# Altium footprint library Mylib.PcbLib: 320 footprints (part 9 of 20)
Each footprint in its own frame and in the unit in brackets; x right, y up, seen from the top. Pads: shape width x height; smd on the part's side, far side on the other; paste and mask are expansions set on the pad; w line width, h text height; cw(c..) or ccw(c..) is an arc to the next point about the centre after c.
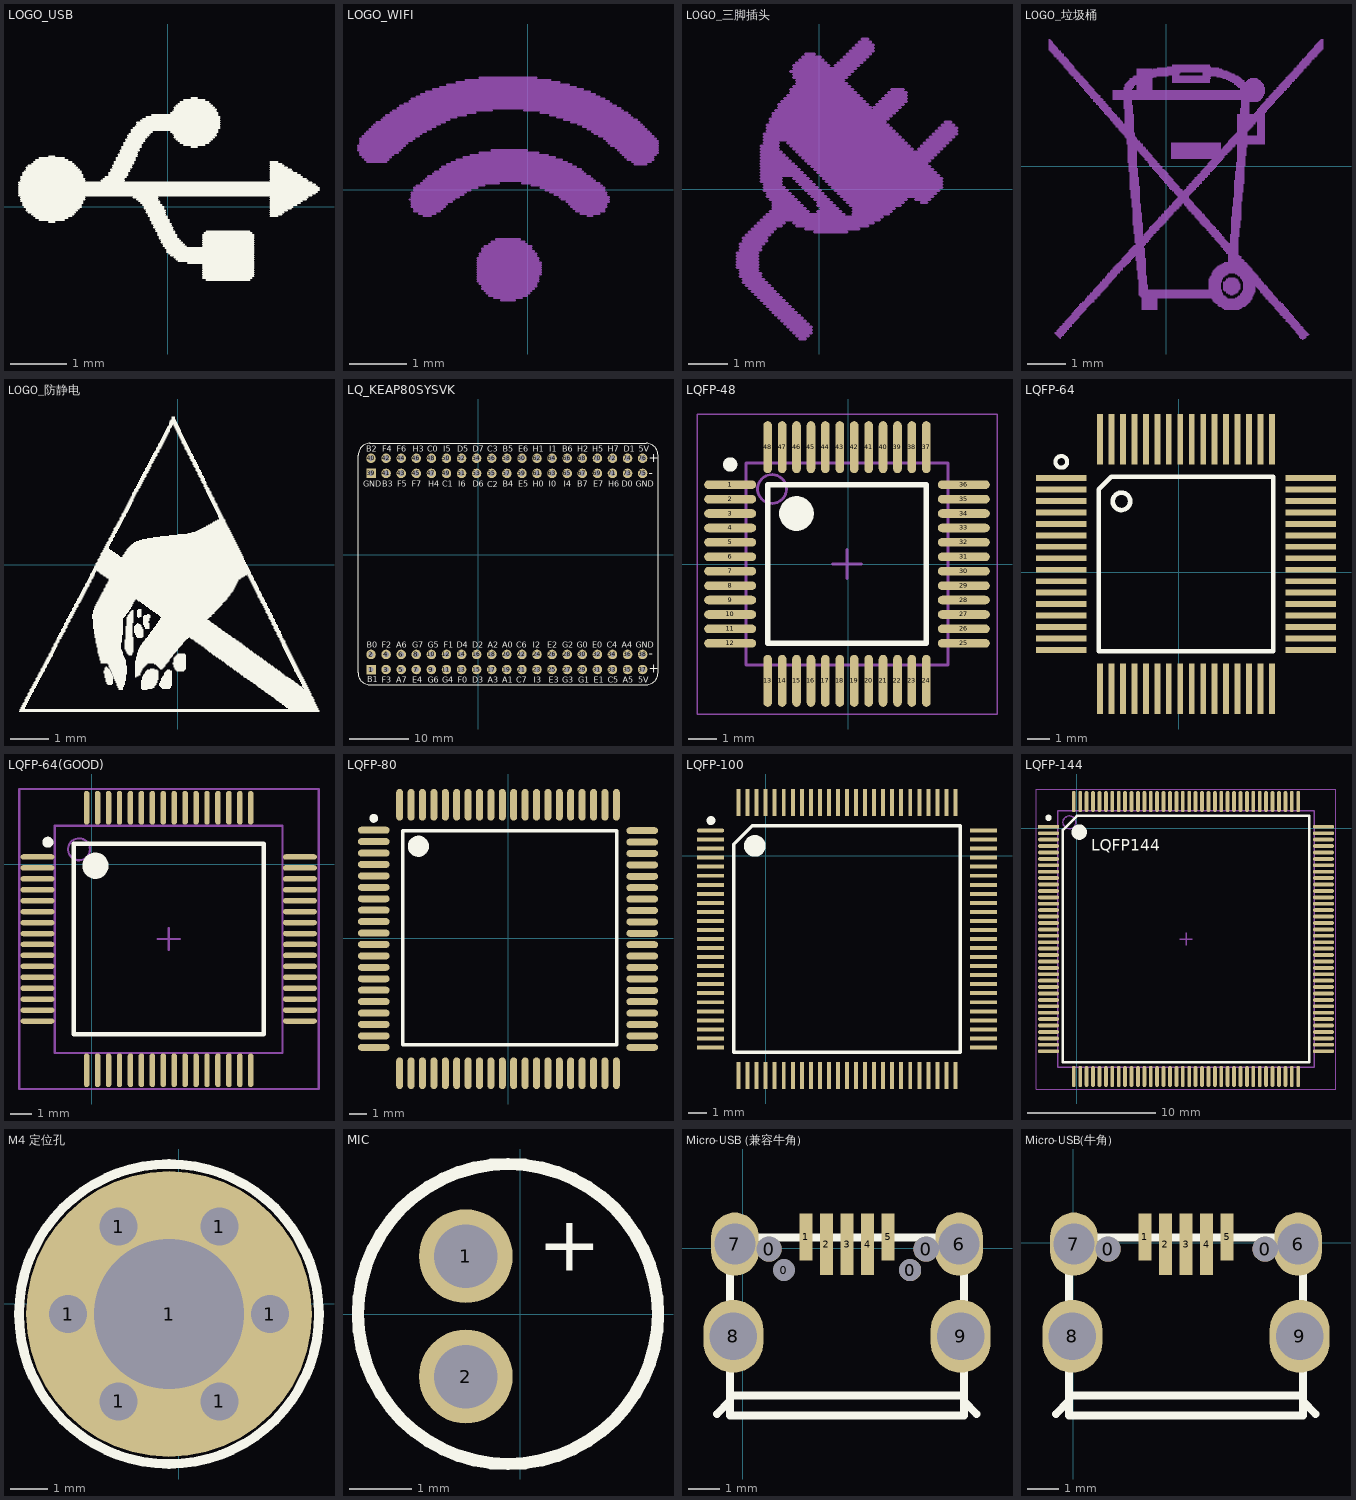
[diagram p8: the footprints below, top view; thin cyan lines are the x and y axes]

## LOGO_USB [mm]
Top Overlay:
  drawing of 166 lines, arcs and shapes, not listed

## LOGO_WIFI [mm]
Top Solder:
  lines w0.041: -2.946,0.686 -2.215,0.686 ; -2.946,0.726 -2.174,0.726 ; -2.946,0.767 -2.134,0.767 ; -2.906,0.605 -2.337,0.605 ; -2.906,0.645 -2.256,0.645 ; -2.906,0.808 -2.093,0.808 ; -2.906,0.848 -2.012,0.848 ; -2.906,0.889 -1.971,0.889 ; -2.865,0.564 -2.377,0.564 ; -2.865,0.93 -1.89,0.93 ; -2.824,0.523 -2.418,0.523 ; -2.824,0.97 -1.849,0.97 ; -2.784,0.483 -2.459,0.483 ; -2.784,1.011 -1.768,1.011 ; -2.743,1.052 -1.687,1.052 ; -2.703,1.092 -1.605,1.092 ; -2.662,1.133 -1.524,1.133 ; -2.621,1.173 -1.443,1.173 ; -2.54,1.214 -1.361,1.214 ; -2.499,1.255 -1.24,1.255 ; -2.459,1.295 -1.077,1.295 ; -2.377,1.336 -0.914,1.336 ; -2.337,1.377 -0.63,1.377 ; -2.256,1.417 1.605,1.417 ; -2.215,1.458 1.524,1.458 ; -2.134,1.499 1.443,1.499 ; -2.052,-0.168 -1.28,-0.168 ; -2.052,1.539 1.402,1.539 ; -2.012,-0.29 -1.443,-0.29 ; -2.012,-0.249 -1.402,-0.249 ; -2.012,-0.208 -1.321,-0.208 ; -2.012,-0.127 -1.199,-0.127 ; -2.012,-0.086 -1.118,-0.086 ; -2.012,-0.046 -1.077,-0.046 ; -2.012,1.58 1.321,1.58 ; -1.971,-0.371 -1.524,-0.371 ; -1.971,-0.33 -1.483,-0.33 ; -1.971,-0.005 -0.996,-0.005 ; -1.971,0.036 -0.874,0.036 ; -1.93,0.076 -0.752,0.076 ; -1.93,1.621 1.24,1.621 ; -1.89,-0.411 -1.605,-0.411 ; -1.849,0.117 -0.508,0.117 ; -1.849,1.661 1.158,1.661 ; -1.808,-0.452 -1.687,-0.452 ; -1.808,0.157 1.158,0.157 ; -1.768,0.198 1.118,0.198 ; -1.768,1.702 1.077,1.702 ; -1.727,0.239 1.077,0.239 ; -1.646,0.279 0.996,0.279 ; -1.646,1.742 0.955,1.742 ; -1.605,0.32 0.955,0.32 ; -1.524,0.361 0.914,0.361 ; -1.524,1.783 0.833,1.783 ; -1.483,0.401 0.833,0.401 ; -1.402,0.442 0.752,0.442 ; -1.402,1.824 0.711,1.824 ; -1.321,0.483 0.671,0.483 ; -1.24,0.523 0.589,0.523 ; -1.24,1.864 0.549,1.864 ; -1.118,0.564 0.467,0.564 ; -1.077,1.905 0.386,1.905 ; -0.996,0.605 0.345,0.605 ; -0.874,-1.59 0.183,-1.59 ; -0.874,-1.549 0.183,-1.549 ; -0.874,-1.509 0.183,-1.509 ; -0.874,-1.468 0.224,-1.468 ; -0.874,-1.427 0.224,-1.427 ; -0.874,-1.387 0.224,-1.387 ; -0.874,-1.346 0.224,-1.346 ; -0.874,-1.306 0.224,-1.306 ; -0.874,-1.265 0.224,-1.265 ; -0.874,-1.224 0.183,-1.224 ; -0.874,-1.184 0.183,-1.184 ; -0.833,-1.631 0.142,-1.631 ; -0.833,-1.143 0.142,-1.143 ; -0.833,-1.102 0.142,-1.102 ; -0.833,0.645 0.183,0.645 ; -0.833,1.946 0.142,1.946 ; -0.792,-1.712 0.102,-1.712 ; -0.792,-1.671 0.142,-1.671 ; -0.792,-1.062 0.102,-1.062 ; -0.792,-1.021 0.061,-1.021 ; -0.752,-1.753 0.061,-1.753 ; -0.752,-0.98 0.061,-0.98 ; -0.711,-1.793 0.02,-1.793 ; -0.671,-1.834 -0.02,-1.834 ; -0.671,-0.94 -0.02,-0.94 ; -0.63,-0.899 -0.061,-0.899 ; -0.63,0.686 -0.02,0.686 ; -0.589,-1.875 -0.102,-1.875 ; -0.549,-0.859 -0.142,-0.859 ; -0.467,-1.915 -0.224,-1.915 ; -0.102,0.117 1.24,0.117 ; -0.061,1.377 1.646,1.377 ; 0.061,0.076 1.28,0.076 ; 0.224,0.036 1.321,0.036 ; 0.224,1.336 1.727,1.336 ; 0.305,-0.005 1.321,-0.005 ; 0.386,-0.046 1.361,-0.046 ; 0.386,1.295 1.768,1.295 ; 0.467,-0.086 1.361,-0.086 ; 0.508,1.255 1.808,1.255 ; 0.549,-0.127 1.402,-0.127 ; 0.589,-0.168 1.402,-0.168 ; 0.63,1.214 1.89,1.214 ; 0.671,-0.208 1.402,-0.208 ; 0.711,-0.249 1.361,-0.249 ; 0.752,-0.29 1.361,-0.29 ; 0.752,1.173 1.93,1.173 ; 0.792,-0.33 1.321,-0.33 ; 0.833,-0.371 1.321,-0.371 ; 0.874,1.133 1.971,1.133 ; 0.914,-0.411 1.24,-0.411 ; 0.955,1.092 2.012,1.092 ; 1.036,-0.452 1.118,-0.452 ; 1.036,1.052 2.052,1.052 ; 1.118,1.011 2.093,1.011 ; 1.158,0.97 2.134,0.97 ; 1.24,0.93 2.174,0.93 ; 1.321,0.889 2.215,0.889 ; 1.361,0.848 2.256,0.848 ; 1.402,0.808 2.256,0.808 ; 1.443,0.767 2.256,0.767 ; 1.524,0.726 2.256,0.726 ; 1.565,0.686 2.256,0.686 ; 1.605,0.645 2.256,0.645 ; 1.646,0.605 2.215,0.605 ; 1.687,0.564 2.174,0.564 ; 1.727,0.523 2.174,0.523 ; 1.808,0.483 2.134,0.483 ; 1.849,0.442 2.052,0.442

## LOGO_三脚插头 [mm]
Top Solder:
  drawing of 167 lines, arcs and shapes, not listed

## LOGO_垃圾桶 [mm]
Top Solder:
  drawing of 1026 lines, arcs and shapes, not listed

## LOGO_防静电 [mm]
Top Overlay:
  drawing of 990 lines, arcs and shapes, not listed

## LQ_KEAP80SYSVK [mm]
pads (76):
  rect 1.6x1.6 hole 0.9: 1(-18.016,-19.342) 39(-18.016,13.678)
  round 1.6 hole 0.9: 2(-18.016,-16.802) 3(-15.476,-19.342) 4(-15.476,-16.802) 5(-12.936,-19.342) 6(-12.936,-16.802) 7(-10.396,-19.342) 8(-10.396,-16.802) 9(-7.856,-19.342) 10(-7.856,-16.802) 11(-5.316,-19.342) 12(-5.316,-16.802) 13(-2.776,-19.342) 14(-2.776,-16.802) 15(-0.236,-19.342) 16(-0.236,-16.802) 17(2.304,-19.342) 18(2.304,-16.802) 19(4.844,-19.342) 20(4.844,-16.802) 21(7.384,-19.342) 22(7.384,-16.802) 23(9.924,-19.342) 24(9.924,-16.802) 25(12.464,-19.342) 26(12.464,-16.802) 27(15.004,-19.342) 28(15.004,-16.802) 29(17.544,-19.342) 30(17.544,-16.802) 31(20.084,-19.342) 32(20.084,-16.802) 33(22.624,-19.342) 34(22.624,-16.802) 35(25.164,-19.342) 36(25.164,-16.802) 37(27.704,-19.342) 38(27.704,-16.802) 40(-18.016,16.218) 41(-15.476,13.678) 42(-15.476,16.218) 43(-12.936,13.678) 44(-12.936,16.218) 45(-10.396,13.678) 46(-10.396,16.218) 47(-7.856,13.678) 48(-7.856,16.218) 49(-5.316,13.678) 50(-5.316,16.218) 51(-2.776,13.678) 52(-2.776,16.218) 53(-0.236,13.678) 54(-0.236,16.218) 55(2.304,13.678) 56(2.304,16.218) 57(4.844,13.678) 58(4.844,16.218) 59(7.384,13.678) 60(7.384,16.218) 61(9.924,13.678) 62(9.924,16.218) 63(12.464,13.678) 64(12.464,16.218) 65(15.004,13.678) 66(15.004,16.218) 67(17.544,13.678) 68(17.544,16.218) 69(20.084,13.678) 70(20.084,16.218) 71(22.624,13.678) 72(22.624,16.218) 73(25.164,13.678) 74(25.164,16.218) 75(27.704,13.678) 76(27.704,16.218)
Top Overlay:
  lines w0.2: -20.208,16.739 -20.208,-19.905 ccw(c-18.208,-19.905) -18.208,-21.905 28.292,-21.905 ccw(c28.292,-19.905) 30.292,-19.905 30.292,16.739 ccw(c28.292,16.739) 28.292,18.739 -18.208,18.739 ; -20.158,16.749 cw(c-18.158,16.749) -18.158,18.749
  text "-" at 28.752,13.039 h1.5
  text "+" at 28.742,-19.901 h1.5
  text "-" at 28.752,-17.401 h1.5
  text "+" at 28.762,15.579 h1.5
  text "C3" at 1.522,17.289 h1
  text "H2" at 16.702,17.289 h1
  text "5V" at 26.992,-21.561 h1
  text "A5" at 24.322,-21.561 h1
  text "C5" at 21.822,-21.561 h1
  text "E1" at 19.482,-21.551 h1
  text "G1" at 16.902,-21.561 h1
  text "G3" at 14.132,-21.561 h1
  text "E3" at 11.882,-21.551 h1
  text "I3" at 9.352,-21.561 h1
  text "C7" at 6.472,-21.561 h1
  text "A1" at 4.082,-21.561 h1
  text "A3" at 1.602,-21.561 h1
  text "D3" at -0.938,-21.561 h1
  text "F0" at -3.428,-21.561 h1
  text "G4" at -6.068,-21.561 h1
  text "G6" at -8.488,-21.561 h1
  text "E4" at -11.048,-21.561 h1
  text "A7" at -13.768,-21.561 h1
  text "F3" at -16.208,-21.561 h1
  text "GND" at 26.532,-15.641 h1
  text "A4" at 24.212,-15.641 h1
  text "C4" at 21.652,-15.641 h1
  text "E0" at 19.192,-15.641 h1
  text "G0" at 16.642,-15.641 h1
  text "G2" at 14.132,-15.641 h1
  text "E2" at 11.642,-15.641 h1
  text "I2" at 9.212,-15.641 h1
  text "C6" at 6.472,-15.641 h1
  text "A0" at 4.082,-15.641 h1
  text "A2" at 1.602,-15.641 h1
  text "D2" at -0.938,-15.641 h1
  text "D4" at -3.548,-15.641 h1
  text "F1" at -5.798,-15.641 h1
  text "G5" at -8.488,-15.641 h1
  text "G7" at -11.048,-15.641 h1
  text "A6" at -13.768,-15.641 h1
  text "F2" at -16.208,-15.641 h1
  text "B0" at -18.758,-15.641 h1
  text "GND" at 26.512,11.399 h1
  text "D0" at 24.192,11.399 h1
  text "H6" at 21.952,11.399 h1
  text "E7" at 19.392,11.389 h1
  text "B7" at 16.722,11.399 h1
  text "I4" at 14.442,11.389 h1
  text "I0" at 11.872,11.389 h1
  text "H0" at 9.222,11.399 h1
  text "E5" at 6.772,11.389 h1
  text "B4" at 4.162,11.399 h1
  text "C2" at 1.552,11.379 h1
  text "D6" at -0.858,11.399 h1
  text "I6" at -3.308,11.429 h1
  text "C1" at -5.988,11.399 h1
  text "H4" at -8.408,11.399 h1
  text "F7" at -11.138,11.389 h1
  text "F5" at -13.568,11.389 h1
  text "B3" at -16.128,11.399 h1
  text "GND" at -19.328,11.429 h1
  text "5V" at 27.052,17.289 h1
  text "D1" at 24.532,17.289 h1
  text "H7" at 21.872,17.289 h1
  text "H5" at 19.252,17.289 h1
  text "B6" at 14.192,17.289 h1
  text "I1" at 11.962,17.289 h1
  text "H1" at 9.232,17.289 h1
  text "E6" at 6.772,17.289 h1
  text "B5" at 4.142,17.289 h1
  text "D7" at -0.878,17.289 h1
  text "D5" at -3.488,17.289 h1
  text "I5" at -5.878,17.319 h1
  text "C0" at -8.568,17.289 h1
  text "H3" at -10.988,17.289 h1
  text "F6" at -13.708,17.289 h1
  text "F4" at -16.148,17.289 h1
  text "B2" at -18.788,17.289 h1
  text "B1" at -18.618,-21.521 h1

## LQFP-48 [mm]
pads (48):
  oval 1.8x0.3 smd: 1(-4.101,2.75) 2(-4.101,2.25) 3(-4.101,1.75) 4(-4.101,1.25) 5(-4.101,0.75) 6(-4.101,0.25) 7(-4.101,-0.25) 8(-4.101,-0.75) 9(-4.101,-1.25) 10(-4.101,-1.75) 11(-4.101,-2.25) 12(-4.101,-2.75) 25(3.999,-2.75) 26(3.999,-2.25) 27(3.999,-1.75) 28(3.999,-1.25) 29(3.999,-0.75) 30(3.999,-0.25) 31(3.999,0.25) 32(3.999,0.75) 33(3.999,1.25) 34(3.999,1.75) 35(3.999,2.25) 36(3.999,2.75)
  oval 0.3x1.8 smd: 13(-2.801,-4.05) 14(-2.301,-4.05) 15(-1.801,-4.05) 16(-1.301,-4.05) 17(-0.801,-4.05) 18(-0.301,-4.05) 19(0.199,-4.05) 20(0.699,-4.05) 21(1.199,-4.05) 22(1.699,-4.05) 23(2.199,-4.05) 24(2.699,-4.05) 37(2.699,4.05) 38(2.199,4.05) 39(1.699,4.05) 40(1.199,4.05) 41(0.699,4.05) 42(0.199,4.05) 43(-0.301,4.05) 44(-0.801,4.05) 45(-1.301,4.05) 46(-1.801,4.05) 47(-2.301,4.05) 48(-2.801,4.05)
Top Overlay:
  circle w0.25: c-4.101,3.45 r0.125
  circle w0.6: c-1.801,1.75 r0.3
  lines w0.2: -2.801,-2.75 -2.801,2.75 2.699,2.75 2.699,-2.75 -2.801,-2.75
Mechanical 13:
  circle w0.1: c-2.651,2.6 r0.5
  lines w0.1: -3.551,-3.5 -3.551,3.5 3.449,3.5 3.449,-3.5 -3.551,-3.5
Mechanical 15:
  lines w0.05: -5.251,-5.2 -5.251,5.2 5.149,5.2 5.149,-5.2 -5.251,-5.2
  lines w0.1: -0.551,0 0.449,0 ; -0.051,-0.5 -0.051,0.5
3D body "LQFP48-7x7.STEP": height 1.45, standoff 0, extent -4.554,-4.503 4.452,4.503

## LQFP-64 [mil]
pads (64):
  rect 86.61x10 smd: 1(-202,162) 2(-202,142.31) 3(-202,122.63) 4(-202,102.94) 5(-202,83.26) 6(-202,63.58) 7(-202,43.89) 8(-202,24.21) 9(-202,4.52) 10(-202,-15.17) 11(-202,-34.85) 12(-202,-54.54) 13(-202,-74.22) 14(-202,-93.91) 15(-202,-113.59) 16(-202,-133.27) 33(227.13,-133.27) 34(227.13,-113.59) 35(227.13,-93.9) 36(227.13,-74.22) 37(227.13,-54.54) 38(227.13,-34.85) 39(227.13,-15.17) 40(227.13,4.52) 41(227.13,24.21) 42(227.13,43.89) 43(227.13,63.58) 44(227.13,83.26) 45(227.13,102.95) 46(227.13,122.63) 47(227.13,142.31) 48(227.13,162)
  rect 10x86.61 smd: 17(-135.07,-200.2) 18(-115.39,-200.2) 19(-95.7,-200.21) 20(-76.02,-200.2) 21(-56.33,-200.2) 22(-36.65,-200.2) 23(-16.96,-200.21) 24(2.72,-200.2) 25(22.41,-200.2) 26(42.09,-200.21) 27(61.78,-200.2) 28(81.46,-200.2) 29(101.15,-200.21) 30(120.83,-200.2) 31(140.52,-200.2) 32(160.21,-200.2) 49(160.2,228.93) 50(140.52,228.93) 51(120.83,228.93) 52(101.15,228.93) 53(81.46,228.93) 54(61.78,228.93) 55(42.09,228.93) 56(22.41,228.93) 57(2.72,228.93) 58(-16.96,228.93) 59(-36.65,228.93) 60(-56.33,228.93) 61(-76.02,228.93) 62(-95.7,228.93) 63(-115.39,228.93) 64(-135.07,228.93)
Top Overlay:
  circle w7: c-201.77,189.96 r10
  circle w7.87: c-98.43,122.05 r15
  lines w7.87: -137.63,-135.83 -137.63,142.88 -115.95,164.56 162.76,164.56 162.76,-135.83 -137.63,-135.83
3D body: height 63.78, standoff -0.28, extent -226.24,-225.4 251.84,252.68

## LQFP-64(GOOD) [mm]
pads (64):
  oval 1.55x0.25 smd: 1(-2.486,0.325) 2(-2.486,-0.175) 3(-2.486,-0.676) 4(-2.486,-1.175) 5(-2.486,-1.675) 6(-2.486,-2.175) 7(-2.486,-2.675) 8(-2.486,-3.176) 9(-2.486,-3.675) 10(-2.486,-4.175) 11(-2.486,-4.675) 12(-2.486,-5.175) 13(-2.486,-5.676) 14(-2.486,-6.175) 15(-2.486,-6.675) 16(-2.486,-7.175) 33(9.514,-7.175) 34(9.514,-6.675) 35(9.514,-6.175) 36(9.514,-5.676) 37(9.514,-5.175) 38(9.514,-4.675) 39(9.514,-4.175) 40(9.514,-3.675) 41(9.514,-3.176) 42(9.514,-2.675) 43(9.514,-2.175) 44(9.514,-1.675) 45(9.514,-1.175) 46(9.514,-0.676) 47(9.514,-0.175) 48(9.514,0.325)
  oval 0.25x1.55 smd: 17(-0.236,-9.426) 18(0.263,-9.426) 19(0.764,-9.426) 20(1.264,-9.426) 21(1.763,-9.426) 22(2.264,-9.426) 23(2.763,-9.426) 24(3.264,-9.426) 25(3.764,-9.426) 26(4.263,-9.426) 27(4.764,-9.426) 28(5.263,-9.426) 29(5.764,-9.426) 30(6.264,-9.426) 31(6.763,-9.426) 32(7.264,-9.426) 49(7.264,2.575) 50(6.763,2.575) 51(6.264,2.575) 52(5.764,2.575) 53(5.263,2.575) 54(4.764,2.575) 55(4.263,2.575) 56(3.764,2.575) 57(3.264,2.575) 58(2.763,2.575) 59(2.264,2.575) 60(1.763,2.575) 61(1.264,2.575) 62(0.764,2.575) 63(0.263,2.575) 64(-0.236,2.575)
Top Overlay:
  circle w0.25: c-2.011,1 r0.125
  circle w0.6: c0.163,-0.075 r0.3
  lines w0.2: -0.837,-7.775 -0.837,0.925 7.863,0.925 7.863,-7.775 -0.837,-7.775
Mechanical 13:
  circle w0.1: c-0.586,0.674 r0.5
  lines w0.1: -1.693,-8.632 -1.693,1.756 8.721,1.756 8.721,-8.632 -1.693,-8.632
Mechanical 15:
  lines w0.1: 3.013,-3.425 4.013,-3.425 ; 3.514,-3.925 3.514,-2.925 ; -3.319,-10.283 -3.319,3.433 10.372,3.433 10.372,-10.283 -3.319,-10.283
3D body: height 1.2, standoff 0, extent -1.693,-8.632 8.721,1.782
3D body: height 0.3, standoff 0, extent 7.137,2.003 7.391,3.146
3D body: height 0.3, standoff 0, extent 6.646,2.003 6.9,3.146
3D body: height 0.3, standoff 0, extent 6.146,2.003 6.4,3.146
3D body: height 0.3, standoff 0, extent 5.646,2.003 5.9,3.146
3D body: height 0.3, standoff 0, extent 5.146,2.003 5.4,3.146
3D body: height 0.3, standoff 0, extent 4.646,2.003 4.9,3.146
3D body: height 0.3, standoff 0, extent 4.146,2.003 4.4,3.146
3D body: height 0.3, standoff 0, extent 3.646,2.003 3.9,3.146
3D body: height 0.3, standoff 0, extent 3.146,2.003 3.4,3.146
3D body: height 0.3, standoff 0, extent 2.646,2.003 2.9,3.146
3D body: height 0.3, standoff 0, extent 2.146,2.003 2.4,3.146
3D body: height 0.3, standoff 0, extent 1.646,2.003 1.9,3.146
3D body: height 0.3, standoff 0, extent 1.146,2.003 1.4,3.146
3D body: height 0.3, standoff 0, extent 0.646,2.003 0.9,3.146
3D body: height 0.3, standoff 0, extent 0.146,2.003 0.4,3.146
3D body: height 0.3, standoff 0, extent -0.354,2.003 -0.1,3.146
3D body: height 0.3, standoff 0, extent -3.04,-7.312 -1.897,-7.058
3D body: height 0.3, standoff 0, extent -3.04,-6.812 -1.897,-6.558
3D body: height 0.3, standoff 0, extent -3.04,-6.312 -1.897,-6.058
3D body: height 0.3, standoff 0, extent -3.04,-5.812 -1.897,-5.558
3D body: height 0.3, standoff 0, extent -3.04,-5.312 -1.897,-5.058
3D body: height 0.3, standoff 0, extent -3.04,-4.812 -1.897,-4.558
3D body: height 0.3, standoff 0, extent -3.04,-4.312 -1.897,-4.058
3D body: height 0.3, standoff 0, extent -3.04,-3.812 -1.897,-3.558
3D body: height 0.3, standoff 0, extent -3.04,-3.312 -1.897,-3.058
3D body: height 0.3, standoff 0, extent -3.04,-2.812 -1.897,-2.558
3D body: height 0.3, standoff 0, extent -3.04,-2.312 -1.897,-2.058
3D body: height 0.3, standoff 0, extent -3.04,-1.812 -1.897,-1.558
3D body: height 0.3, standoff 0, extent -3.04,-1.312 -1.897,-1.058
3D body: height 0.3, standoff 0, extent -3.04,-0.812 -1.897,-0.558
3D body: height 0.3, standoff 0, extent -3.04,-0.312 -1.897,-0.058
3D body: height 0.3, standoff 0, extent -3.04,0.198 -1.897,0.452
3D body: height 0.3, standoff 0, extent 8.942,-7.302 10.085,-7.048
3D body: height 0.3, standoff 0, extent 8.942,-6.812 10.085,-6.558
3D body: height 0.3, standoff 0, extent 8.942,-6.312 10.085,-6.058
3D body: height 0.3, standoff 0, extent 8.942,-5.812 10.085,-5.558
3D body: height 0.3, standoff 0, extent 8.942,-5.312 10.085,-5.058
3D body: height 0.3, standoff 0, extent 8.942,-4.812 10.085,-4.558
3D body: height 0.3, standoff 0, extent 8.942,-4.312 10.085,-4.058
3D body: height 0.3, standoff 0, extent 8.942,-3.812 10.085,-3.558
3D body: height 0.3, standoff 0, extent 8.942,-3.312 10.085,-3.058
3D body: height 0.3, standoff 0, extent 8.942,-2.812 10.085,-2.558
3D body: height 0.3, standoff 0, extent 8.942,-2.312 10.085,-2.058
3D body: height 0.3, standoff 0, extent 8.942,-1.812 10.085,-1.558
3D body: height 0.3, standoff 0, extent 8.942,-1.312 10.085,-1.058
3D body: height 0.3, standoff 0, extent 8.942,-0.812 10.085,-0.558
3D body: height 0.3, standoff 0, extent 8.942,-0.312 10.085,-0.058
3D body: height 0.3, standoff 0, extent 8.942,0.198 10.085,0.452
3D body: height 0.3, standoff 0, extent 7.162,-9.966 7.416,-8.823
3D body: height 0.3, standoff 0, extent 6.662,-9.966 6.916,-8.823
3D body: height 0.3, standoff 0, extent 6.162,-9.966 6.416,-8.823
3D body: height 0.3, standoff 0, extent 5.662,-9.966 5.916,-8.823
3D body: height 0.3, standoff 0, extent 5.162,-9.966 5.416,-8.823
3D body: height 0.3, standoff 0, extent 4.662,-9.966 4.916,-8.823
3D body: height 0.3, standoff 0, extent 4.162,-9.966 4.416,-8.823
3D body: height 0.3, standoff 0, extent 3.662,-9.966 3.916,-8.823
3D body: height 0.3, standoff 0, extent 3.162,-9.966 3.416,-8.823
3D body: height 0.3, standoff 0, extent 2.662,-9.966 2.916,-8.823
3D body: height 0.3, standoff 0, extent 2.162,-9.966 2.416,-8.823
3D body: height 0.3, standoff 0, extent 1.662,-9.966 1.916,-8.823
3D body: height 0.3, standoff 0, extent 1.162,-9.966 1.416,-8.823
3D body: height 0.3, standoff 0, extent 0.662,-9.966 0.916,-8.823
3D body: height 0.3, standoff 0, extent 0.162,-9.966 0.416,-8.823
3D body: height 0.3, standoff 0, extent -0.338,-9.966 -0.084,-8.823
3D body: height 1.21, standoff 0, extent -0.596,0.287 -0.198,0.686

## LQFP-80 [mm]
pads (80):
  oval 1.8x0.4 smd: 1(-7.66,6.149) 2(-7.66,5.497) 3(-7.66,4.846) 4(-7.66,4.195) 5(-7.66,3.543) 6(-7.66,2.892) 7(-7.66,2.24) 8(-7.66,1.589) 9(-7.66,0.937) 10(-7.66,0.286) 11(-7.66,-0.365) 12(-7.66,-1.017) 13(-7.66,-1.668) 14(-7.66,-2.32) 15(-7.66,-2.971) 16(-7.66,-3.623) 17(-7.66,-4.274) 18(-7.66,-4.925) 19(-7.66,-5.577) 20(-7.66,-6.228) 41(7.64,-6.228) 42(7.64,-5.578) 43(7.64,-4.928) 44(7.64,-4.278) 45(7.64,-3.628) 46(7.64,-2.978) 47(7.64,-2.328) 48(7.64,-1.678) 49(7.64,-1.028) 50(7.64,-0.378) 51(7.64,0.272) 52(7.64,0.922) 53(7.64,1.572) 54(7.64,2.222) 55(7.64,2.872) 56(7.64,3.522) 57(7.64,4.172) 58(7.64,4.822) 59(7.64,5.472) 60(7.64,6.122)
  oval 0.4x1.8 smd: 21(-6.185,-7.703) 22(-5.535,-7.703) 23(-4.885,-7.703) 24(-4.235,-7.703) 25(-3.585,-7.703) 26(-2.935,-7.703) 27(-2.285,-7.703) 28(-1.635,-7.703) 29(-0.985,-7.703) 30(-0.335,-7.703) 31(0.315,-7.703) 32(0.965,-7.703) 33(1.615,-7.703) 34(2.265,-7.703) 35(2.915,-7.703) 36(3.565,-7.703) 37(4.215,-7.703) 38(4.865,-7.703) 39(5.515,-7.703) 40(6.165,-7.703) 61(6.165,7.597) 62(5.515,7.597) 63(4.865,7.597) 64(4.215,7.597) 65(3.565,7.597) 66(2.915,7.597) 67(2.265,7.597) 68(1.615,7.597) 69(0.965,7.597) 70(0.315,7.597) 71(-0.335,7.597) 72(-0.985,7.597) 73(-1.635,7.597) 74(-2.285,7.597) 75(-2.935,7.597) 76(-3.585,7.597) 77(-4.235,7.597) 78(-4.885,7.597) 79(-5.535,7.597) 80(-6.185,7.597)
Top Overlay:
  circle w0.6: c-5.12,5.233 r0.3
  circle w0.25: c-7.66,6.822 r0.125
  lines w0.2: -6.009,-6.07 6.183,-6.07 6.183,6.122 -6.009,6.122 -6.009,-6.07
3D body: height 1.75, standoff 0, extent -8.031,-8.084 8.006,7.952

## LQFP-100 [mm]
pads (100):
  oval 1.5x0.22 smd: 1(-3.048,1.397)
  rect 1.5x0.22 smd: 2(-3.048,0.897) 3(-3.048,0.397) 4(-3.048,-0.103) 5(-3.048,-0.603) 6(-3.048,-1.103) 7(-3.048,-1.603) 8(-3.048,-2.103) 9(-3.048,-2.603) 10(-3.048,-3.103) 11(-3.048,-3.603) 12(-3.048,-4.103) 13(-3.048,-4.603) 14(-3.048,-5.103) 15(-3.048,-5.603) 16(-3.048,-6.103) 17(-3.048,-6.603) 18(-3.048,-7.103) 19(-3.048,-7.603) 20(-3.048,-8.103) 21(-3.048,-8.603) 22(-3.048,-9.103) 23(-3.048,-9.603) 24(-3.048,-10.103) 25(-3.048,-10.603) 51(12.05,-10.603) 52(12.05,-10.103) 53(12.05,-9.603) 54(12.05,-9.103) 55(12.05,-8.603) 56(12.05,-8.103) 57(12.05,-7.603) 58(12.05,-7.103) 59(12.05,-6.603) 60(12.05,-6.103) 61(12.05,-5.603) 62(12.05,-5.103) 63(12.05,-4.603) 64(12.05,-4.103) 65(12.05,-3.603) 66(12.05,-3.103) 67(12.05,-2.603) 68(12.05,-2.103) 69(12.05,-1.603) 70(12.05,-1.103) 71(12.05,-0.603) 72(12.05,-0.103) 73(12.05,0.397) 74(12.05,0.897) 75(12.05,1.397)
  rect 0.22x1.5 smd: 26(-1.499,-12.152) 27(-0.999,-12.152) 28(-0.499,-12.152) 29(0.001,-12.152) 30(0.501,-12.152) 31(1.001,-12.152) 32(1.501,-12.152) 33(2.001,-12.152) 34(2.501,-12.152) 35(3.001,-12.152) 36(3.501,-12.152) 37(4.001,-12.152) 38(4.501,-12.152) 39(5.001,-12.152) 40(5.501,-12.152) 41(6.001,-12.152) 42(6.501,-12.152) 43(7.001,-12.152) 44(7.501,-12.152) 45(8.001,-12.152) 46(8.501,-12.152) 47(9.001,-12.152) 48(9.501,-12.152) 49(10.001,-12.152) 50(10.501,-12.152) 76(10.501,2.946) 77(10.001,2.946) 78(9.501,2.946) 79(9.001,2.946) 80(8.501,2.946) 81(8.001,2.946) 82(7.501,2.946) 83(7.001,2.946) 84(6.501,2.946) 85(6.001,2.946) 86(5.501,2.946) 87(5.001,2.946) 88(4.501,2.946) 89(4.001,2.946) 90(3.501,2.946) 91(3.001,2.946) 92(2.501,2.946) 93(2.001,2.946) 94(1.501,2.946) 95(1.001,2.946) 96(0.501,2.946) 97(0.001,2.946) 98(-0.499,2.946) 99(-0.999,2.946) 100(-1.499,2.946)
Top Overlay:
  circle w0.6: c-0.6,0.55 r0.3
  circle w0.25: c-3.025,1.95 r0.125
  lines w0.2: -1.763,-10.867 -1.763,0.637 -0.739,1.661 10.765,1.661 10.765,-10.867 -1.763,-10.867
3D body: height 1.62, standoff -0.01, extent -3.572,-12.675 12.572,3.468

## LQFP-144 [mm]
pads (144):
  rect 1.651x0.3 smd: 1(-2.199,0.11)
  oval 1.651x0.3 smd: 2(-2.199,-0.39) 3(-2.199,-0.89) 4(-2.199,-1.39) 5(-2.199,-1.89) 6(-2.199,-2.39) 7(-2.199,-2.89) 8(-2.199,-3.39) 9(-2.199,-3.89) 10(-2.199,-4.39) 11(-2.199,-4.89) 12(-2.199,-5.39) 13(-2.199,-5.89) 14(-2.199,-6.39) 15(-2.199,-6.89) 16(-2.199,-7.39) 17(-2.199,-7.89) 18(-2.199,-8.39) 19(-2.199,-8.89) 20(-2.199,-9.39) 21(-2.199,-9.89) 22(-2.199,-10.39) 23(-2.199,-10.89) 24(-2.199,-11.39) 25(-2.199,-11.89) 26(-2.199,-12.39) 27(-2.199,-12.89) 28(-2.199,-13.39) 29(-2.199,-13.89) 30(-2.199,-14.39) 31(-2.199,-14.89) 32(-2.199,-15.39) 33(-2.199,-15.89) 34(-2.199,-16.39) 35(-2.199,-16.89) 36(-2.199,-17.39) 73(19.251,-17.39) 74(19.251,-16.89) 75(19.251,-16.39) 76(19.251,-15.89) 77(19.251,-15.39) 78(19.251,-14.89) 79(19.251,-14.39) 80(19.251,-13.89) 81(19.251,-13.39) 82(19.251,-12.89) 83(19.251,-12.39) 84(19.251,-11.89) 85(19.251,-11.39) 86(19.251,-10.89) 87(19.251,-10.39) 88(19.251,-9.89) 89(19.251,-9.39) 90(19.251,-8.89) 91(19.251,-8.39) 92(19.251,-7.89) 93(19.251,-7.39) 94(19.251,-6.89) 95(19.251,-6.39) 96(19.251,-5.89) 97(19.251,-5.39) 98(19.251,-4.89) 99(19.251,-4.39) 100(19.251,-3.89) 101(19.251,-3.39) 102(19.251,-2.89) 103(19.251,-2.39) 104(19.251,-1.89) 105(19.251,-1.39) 106(19.251,-0.89) 107(19.251,-0.39) 108(19.251,0.11)
  oval 0.3x1.651 smd: 37(-0.224,-19.365) 38(0.276,-19.365) 39(0.776,-19.365) 40(1.276,-19.365) 41(1.776,-19.365) 42(2.276,-19.365) 43(2.776,-19.365) 44(3.276,-19.365) 45(3.776,-19.365) 46(4.276,-19.365) 47(4.776,-19.365) 48(5.276,-19.365) 49(5.776,-19.365) 50(6.276,-19.365) 51(6.776,-19.365) 52(7.276,-19.365) 53(7.776,-19.365) 54(8.276,-19.365) 55(8.776,-19.365) 56(9.276,-19.365) 57(9.776,-19.365) 58(10.276,-19.365) 59(10.776,-19.365) 60(11.276,-19.365) 61(11.776,-19.365) 62(12.276,-19.365) 63(12.776,-19.365) 64(13.276,-19.365) 65(13.776,-19.365) 66(14.276,-19.365) 67(14.776,-19.365) 68(15.276,-19.365) 69(15.776,-19.365) 70(16.276,-19.365) 71(16.776,-19.365) 72(17.276,-19.365) 109(17.276,2.085) 110(16.776,2.085) 111(16.276,2.085) 112(15.776,2.085) 113(15.276,2.085) 114(14.776,2.085) 115(14.276,2.085) 116(13.776,2.085) 117(13.276,2.085) 118(12.776,2.085) 119(12.276,2.085) 120(11.776,2.085) 121(11.276,2.085) 122(10.776,2.085) 123(10.276,2.085) 124(9.776,2.085) 125(9.276,2.085) 126(8.776,2.085) 127(8.276,2.085) 128(7.776,2.085) 129(7.276,2.085) 130(6.776,2.085) 131(6.276,2.085) 132(5.776,2.085) 133(5.276,2.085) 134(4.776,2.085) 135(4.276,2.085) 136(3.776,2.085) 137(3.276,2.085) 138(2.776,2.085) 139(2.276,2.085) 140(1.776,2.085) 141(1.276,2.085) 142(0.776,2.085) 143(0.276,2.085) 144(-0.224,2.085)
Top Overlay:
  circle w0.25: c-2.199,0.81 r0.125
  circle w0.6: c0.2,-0.3 r0.3
  lines w0.2: -1.074,-18.24 18.126,-18.24 18.126,0.96 0.01,0.96 -1.074,-0.124 -1.074,-18.24
  text "LQFP144" at 1.125,-2.05 h1.52
Mechanical 13:
  circle w0.1: c-0.574,0.46 r0.5
  lines w0.1: -1.474,-18.64 -1.474,1.36 18.526,1.36 18.526,-18.64 -1.474,-18.64
Mechanical 15:
  lines w0.05: -3.174,-20.34 -3.174,3.06 20.226,3.06 20.226,-20.34 -3.174,-20.34
  lines w0.1: 8.026,-8.64 9.026,-8.64 ; 8.526,-9.14 8.526,-8.14
3D body "TSQFP50P2200X2200X160-144N.step": height 1.6, standoff 0, extent -2.474,-19.64 19.526,2.36

## M4 定位孔 [mil]
pads (7):
  round 40 hole 40: 1(-116,-11) 1(-63,-102.8) 1(-63,80.8) 1(43,-102.8) 1(43,80.8) 1(96,-11)
  round 300 hole 157.48: 1(-10,-11)
Top Overlay:
  circle w10: c-10,-11 r157.48

## MIC [mm]
pads (2):
  round 1.5 hole 1.016: 1(-0.875,0.925) 2(-0.875,-1)
Top Overlay:
  circle w0.2: c-0.2,0 r2.4
  text "+" at 0.275,0.4 h1.52
3D body "User Library-6022microphone.STEP": height 2.21, standoff -2.85, extent -3.1,-2.975 2.9,3.025

## Micro-USB (兼容牛角) [mm]
pads (13):
  round 0.8 hole 0.8: 0(0.825,-0.025) 0(5.8,-0.025)
  oval 0.47x0.7 hole 0.7: 0(1.294,-0.69)
  round 0.7 hole 0.7: 0(5.294,-0.69)
  rect 0.4x1.5 smd: 1(1.994,0.359) 5(4.594,0.359)
  rect 0.4x1.95 smd: 2(2.644,0.135) 3(3.294,0.135) 4(3.944,0.135)
  oval 1.5x2 hole 1.3: 6(6.844,0.135) 7(-0.256,0.135)
  oval 1.9x2.3 hole 1.5: 8(-0.306,-2.786) 9(6.894,-2.786)
Top Overlay:
  lines w0.254: -0.83,-5.253 -0.406,-4.83 -0.406,-4.665 ; -0.414,-5.295 -0.406,-5.295 ; 7.4,-5.253 6.994,-4.847 6.994,-4.665 ; -0.406,-5.295 6.994,-5.295 6.994,-4.665 ; -0.406,-5.295 -0.406,-4.665 ; -0.406,-4.665 6.994,-4.665 ; -0.406,-4.665 -0.406,0.335 6.994,0.335 6.994,-4.665
3D body "User Library-MicroUSB-B_Molex_105017-0001.STEP": height 0.23, standoff -3.08, extent -0.776,-5.338 7.424,0.092

## Micro-USB(牛角) [mm]
pads (11):
  round 0.8 hole 0.8: 0(1.1,-0.2) 0(6.075,-0.2)
  rect 0.4x1.5 smd: 1(2.269,0.184) 5(4.869,0.184)
  rect 0.4x1.95 smd: 2(2.919,-0.04) 3(3.569,-0.04) 4(4.219,-0.04)
  oval 1.5x2 hole 1.3: 6(7.119,-0.04) 7(0.019,-0.04)
  oval 1.9x2.3 hole 1.5: 8(-0.031,-2.961) 9(7.169,-2.961)
Top Overlay:
  lines w0.254: -0.555,-5.428 -0.131,-5.005 -0.131,-4.84 ; -0.139,-5.47 -0.131,-5.47 ; 7.675,-5.428 7.269,-5.022 7.269,-4.84 ; -0.131,-5.47 7.269,-5.47 7.269,-4.84 ; -0.131,-5.47 -0.131,-4.84 ; -0.131,-4.84 7.269,-4.84 ; -0.131,-4.84 -0.131,0.16 7.269,0.16 7.269,-4.84
3D body "User Library-MicroUSB-B_Molex_105017-0001.STEP": height 0.23, standoff -3.08, extent -0.501,-5.513 7.699,-0.083